# Altium footprint library PcbLib1.PcbLib: 41 footprints (part 3 of 3)
Each footprint in its own frame and in the unit in brackets; x right, y up, seen from the top. Pads: shape width x height; smd on the part's side, far side on the other; paste and mask are expansions set on the pad; w line width, h text height; cw(c..) or ccw(c..) is an arc to the next point about the centre after c.
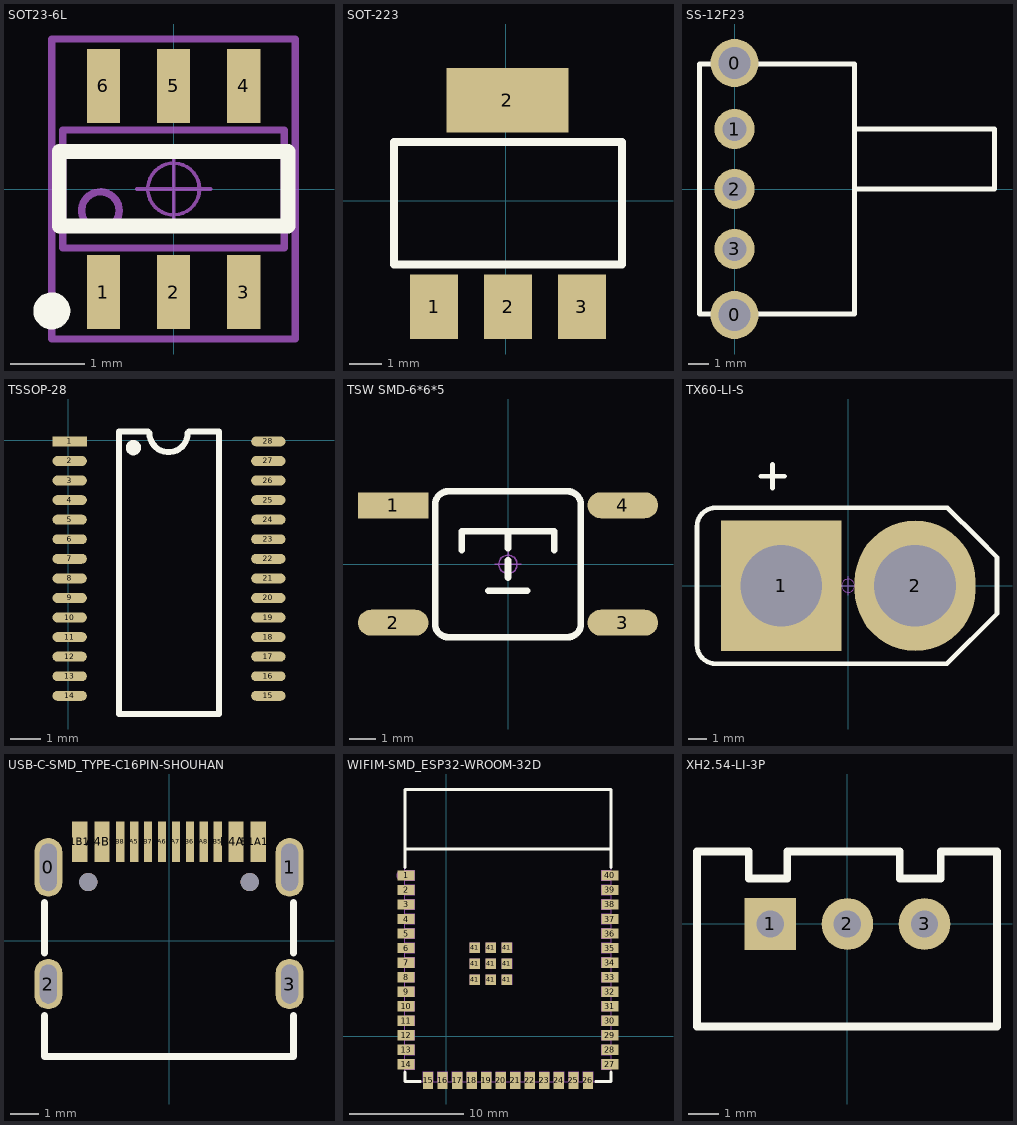
[diagram p2: the footprints below, top view; thin cyan lines are the x and y axes]

## SOT23-6L [mm] "3x1.6x1.1mm(长宽高)"
height 1.45
pads (6):
  rect 0.45x1 smd: 1(-0.95,-1.397) 2(0,-1.397) 3(0.95,-1.397) 4(0.95,1.397) 5(0,1.397) 6(-0.95,1.397)
Top Overlay:
  circle w0.25: c-1.65,-1.651 r0.125
  lines w0.2: -1.55,-0.5 1.55,-0.5 1.55,0.508 -1.55,0.508 -1.55,-0.5
Mechanical 13:
  circle w0.1: c-0.992,-0.292 r0.254
  lines w0.1: -1.5,-0.8 -1.5,0.8 1.5,0.8 1.5,-0.8 -1.5,-0.8
Mechanical 15:
  circle w0.05: c0,0 r0.35
  lines w0.05: -0.5,0 0.5,0 ; 0,-0.5 0,0.5
  lines w0.1: -1.65,-2.032 -1.65,2.032 1.65,2.032 1.65,-2.032 -1.65,-2.032
3D body "SOT23-6.STEP": height 1.15, standoff -0.03, extent -1.5,-1.404 1.5,1.403

## SOT-223 [mil]
pads (4):
  rect 59x79 smd: 1(-88,-130) 2(2.55,-130) 3(93.1,-130)
  rect 150x79 smd: 2(1.88,123.54)
Top Overlay:
  lines w10: -137.45,-78 -137.45,72 142.55,72 142.55,-78 -137.45,-78
3D body "SOT-223_MP04A.STEP": height 66.93, standoff 0, extent -126.41,-138.72 129.5,135.3

## SS-12F23 [mm] "脚距3mm"
pads (5):
  round 2.4 hole 1.6: 0(0,-6.3) 0(0,6.3)
  round 2 hole 1.2: 1(0,3) 2(0,0) 3(0,-3)
Top Overlay:
  lines w0.254: 6,0 13,0 13,3 6,3 ; -1.75,-6.25 -1.75,6.25 -1.5,6.25 0,6.25 6,6.25 6,-6.25 0,-6.25 -1.75,-6.25
3D body "User Library-SLIDE SWITCH SS12F23.STEP": height 5.75, standoff -3.35, extent -0.608,-6.523 12.292,6.477

## TSSOP-28 [mm] "9.70x4.40x1.00 e=0.65（蒜米工坊）"
pads (28):
  rect 1.143x0.33 smd: 1(0.041,-0.046)
  oval 1.143x0.33 smd: 2(0.041,-0.696) 3(0.041,-1.346) 4(0.041,-1.996) 5(0.041,-2.646) 6(0.041,-3.296) 7(0.041,-3.946) 8(0.041,-4.596) 9(0.041,-5.246) 10(0.041,-5.896) 11(0.041,-6.546) 12(0.041,-7.196) 13(0.041,-7.846) 14(0.041,-8.496) 15(6.641,-8.496) 16(6.641,-7.846) 17(6.641,-7.196) 18(6.641,-6.546) 19(6.641,-5.896) 20(6.641,-5.246) 21(6.641,-4.596) 22(6.641,-3.946) 23(6.641,-3.296) 24(6.641,-2.646) 25(6.641,-1.996) 26(6.641,-1.346) 27(6.641,-0.696) 28(6.641,-0.046)
Top Overlay:
  circle w0.254: c2.159,-0.254 r0.127
  lines w0.2: 2.642,0.279 1.676,0.279 1.676,-9.1 5.006,-9.1 5.006,0.279 4.013,0.279 ; 2.692,0.229 ccw(c3.327,0.229) 3.962,0.229
3D body "TSSOP28.STEP": height 1.03, standoff -0.02, extent 0.049,-9.142 6.453,0.658

## TSW SMD-6*6*5 [mm] "6*6*5mm"
pads (4):
  rect 2.7x1 smd: 1(-4.4,2.261)
  oval 2.7x1 smd: 2(-4.4,-2.239) 3(4.4,-2.239) 4(4.4,2.261)
Top Overlay:
  lines w0.254: -1.778,0.533 -1.778,1.27 1.778,1.27 1.778,0.533 ; -0.762,-1.016 0.737,-1.016 ; 0,-0.508 0,0.152 ; 0,0.61 0,1.27 ; -2.794,-2.286 ccw(c-2.286,-2.286) -2.286,-2.794 2.286,-2.794 ccw(c2.286,-2.286) 2.794,-2.286 2.794,2.286 ccw(c2.286,2.286) 2.286,2.794 -2.286,2.794 ccw(c-2.286,2.286) -2.794,2.286 -2.794,-2.286
Mechanical 15:
  circle w0.05: c0,0 r0.35
  lines w0.05: -0.5,0 0.5,0 ; 0,-0.5 0,0.5
3D body "TSW SMD-6x6x5.STEP": height 4.95, standoff -0.03, extent -4.5,-3 4.5,3

## TX60-LI-S [mm] "长：16mm，宽：8.2mm，高：16mm"
pads (2):
  rect 6.5x7 hole 4.4: 1(-3.6,0)
  oval 6.5x7 hole 4.4: 2(3.6,0)
Top Overlay:
  lines w0.254: -4.699,5.893 -3.429,5.893 ; -4.064,5.258 -4.064,6.528 ; -8.128,-3.191 ccw(c-7.128,-3.191) -7.128,-4.191 5.309,-4.191 8,-1.5 8,1.525 6.985,2.54 5.334,4.191 -7.128,4.191 ccw(c-7.128,3.191) -8.128,3.191 -8.128,-3.191
Mechanical 15:
  circle w0.05: c0,0 r0.35
  lines w0.05: -0.5,0 0.5,0 ; 0,-0.5 0,0.5
3D body "TX60-LI-S.STEP": height 16.05, standoff -2.25, extent -8,-4.1 8,4.1

## USB-C-SMD_TYPE-C16PIN-SHOUHAN [mm]
pads (18):
  oval 1x2.1 hole 0.6 slot 1.7 at 90 deg paste-2539.97 mask+0.051: 0(-4.32,2.631) 1(4.32,2.631)
  oval 1x1.8 hole 0.6 slot 1.4 at 90 deg paste-2539.97 mask+0.051: 2(-4.32,-1.549) 3(4.32,-1.549)
  rect 0.55x1.45 smd paste-100 mask+0.051: A1B12(-3.2,3.551) A4B9(-2.4,3.551) B1A12(3.2,3.551) B4A9(2.4,3.551)
  rect 0.3x1.45 smd paste-100 mask+0.051: A5(-1.25,3.551) A6(-0.25,3.551) A7(0.25,3.551) A8(1.25,3.551) B5(1.75,3.551) B6(0.75,3.551) B7(-0.75,3.551) B8(-1.75,3.551)
  round 0.65 hole 0.65 unplated paste-2539.97: ""(-2.89,2.101) ""(2.89,2.101)
Top Overlay:
  lines w0.254: -4.45,-2.669 -4.45,-4.149 4.45,-4.149 4.45,-2.668 ; -4.45,-0.43 -4.45,1.362 ; 4.45,-0.43 4.45,1.362
Top Paste:
  drawing of 16 lines, arcs and shapes, not listed
Mechanical 15:
  circle w0.25: c2.89,2.101 r0.125
  circle w0.25: c-2.89,2.101 r0.125

## WIFIM-SMD_ESP32-WROOM-32D [mm]
pads (49):
  rect 1.5x0.9 smd paste+0 mask+0.05: 1(-3.487,14.045) 2(-3.487,12.775) 3(-3.487,11.505) 4(-3.487,10.235) 5(-3.487,8.965) 6(-3.487,7.695) 7(-3.487,6.425) 8(-3.487,5.155) 9(-3.487,3.885) 10(-3.487,2.615) 11(-3.487,1.345) 12(-3.487,0.075) 13(-3.487,-1.195) 14(-3.487,-2.465) 27(14.312,-2.465) 28(14.312,-1.195) 29(14.312,0.075) 30(14.312,1.345) 31(14.312,2.615) 32(14.312,3.885) 33(14.312,5.155) 34(14.312,6.425) 35(14.312,7.695) 36(14.312,8.965) 37(14.312,10.235) 38(14.312,11.505) 39(14.312,12.775) 40(14.312,14.045)
  rect 0.9x1.5 smd paste+0 mask+0.05: 15(-1.572,-3.864) 16(-0.302,-3.864) 17(0.968,-3.864) 18(2.238,-3.864) 19(3.508,-3.864) 20(4.778,-3.864) 21(6.048,-3.864) 22(7.318,-3.864) 23(8.588,-3.864) 24(9.858,-3.864) 25(11.128,-3.864) 26(12.398,-3.864)
  rect 0.9x0.9 smd: 41(2.513,4.926) 41(2.513,6.326) 41(2.513,7.726) 41(3.913,4.926) 41(3.913,6.326) 41(3.913,7.726) 41(5.313,4.926) 41(5.313,6.326) 41(5.313,7.726)
Top Overlay:
  lines w0.254: -3.587,-3.146 -3.587,-3.964 -2.254,-3.964 ; -3.587,14.726 -3.587,16.136 ; -3.587,16.086 -3.587,21.536 14.413,21.536 14.413,14.726 ; -3.587,16.356 14.413,16.356 ; 13.079,-3.964 14.413,-3.964 14.413,-3.146
Mechanical 6:
  circle w0.4: c-3.937,14.036 r0.2
Mechanical 15:
  drawing of 54 lines, arcs and shapes, not listed

## XH2.54-LI-3P [mm] "接插件，3P"
pads (3):
  rect 1.7x1.7 hole 0.9: 1(-2.54,0)
  round 1.7 hole 0.9: 2(0,0) 3(2.54,0)
Top Overlay:
  lines w0.254: -4.953,-3.378 -4.953,2.388 -3.251,2.388 -3.251,1.5 -1.981,1.5 -1.981,2.388 1.727,2.388 1.727,1.5 3.073,1.5 3.073,2.388 4.928,2.388 4.928,-3.378 -4.953,-3.378
3D body "XH2.54-3P.STEP": height 7.03, standoff -2.47, extent -5.04,-3.3 5.04,2.4